# Altium footprint library Pasivos.PcbLib: 138 footprints (part 6 of 9)
Each footprint in its own frame and in the unit in brackets; x right, y up, seen from the top. Pads: shape width x height; smd on the part's side, far side on the other; paste and mask are expansions set on the pad; w line width, h text height; cw(c..) or ccw(c..) is an arc to the next point about the centre after c.
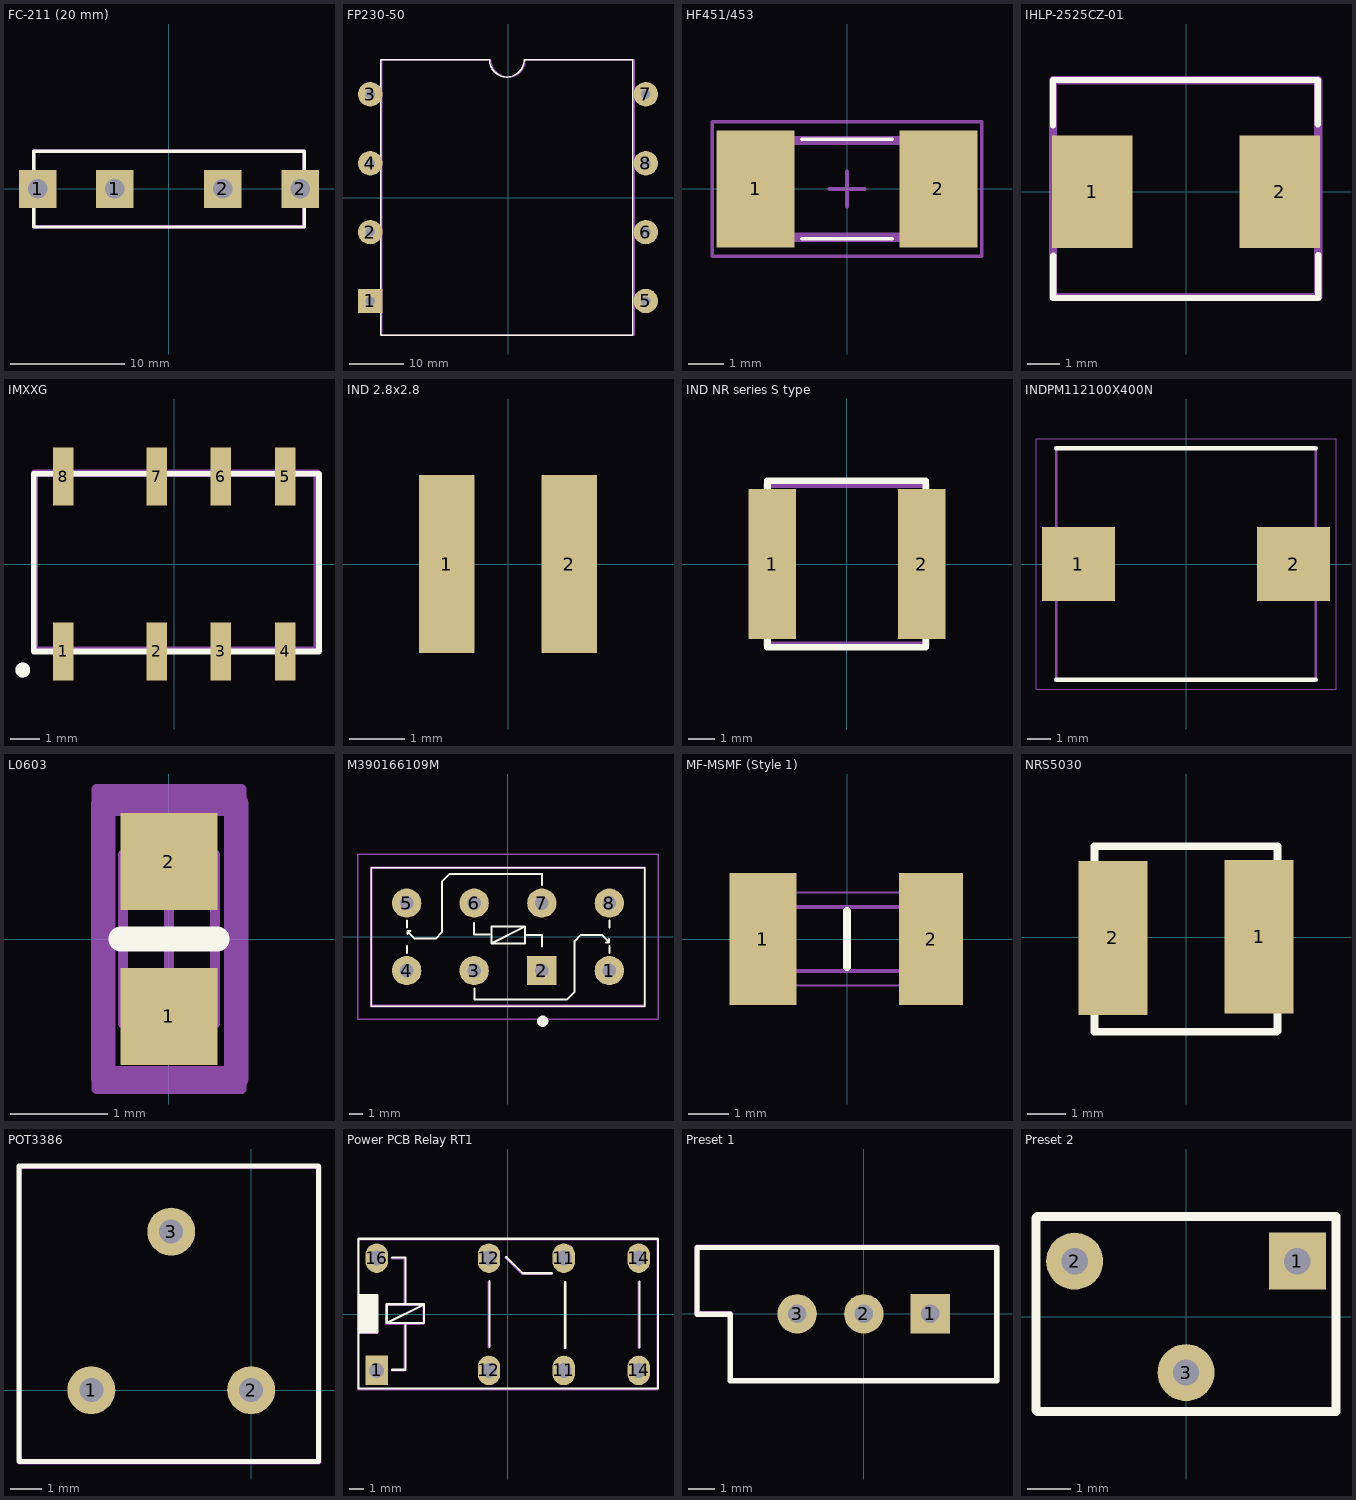
[diagram p5: the footprints below, top view; thin cyan lines are the x and y axes]

## FC-211 (20 mm) [mm] "FUSE CLIP CARTRIDGE 10A PCB"
pads (4):
  rect 3.3x3.3 hole 1.72: 1(-11.485,0) 1(-4.754,0) 2(4.705,0) 2(11.485,0)
Top Overlay:
  lines w0.3: -11.825,-3.333 11.845,-3.333 11.845,3.287 -11.825,3.287 -11.825,-3.333
Mechanical 29:
  lines w0.3: -11.825,-3.3 -11.825,3.32 11.845,3.32 11.845,-3.3 -11.825,-3.3
  text "'.Designator'" at -0.386,-0.079 h0.5
3D body "FC-201 with fuse 5x20.STEP": height 8.63, standoff -3.56, extent -11.684,-3.135 11.694,3.215

## FP230-50 [mm] "Power Transformer"
pads (8):
  rect 4.5x4.5 hole 1.7: 1(-25.4,-19.05)
  round 4.5 hole 1.7: 2(-25.4,-6.35) 3(-25.4,19.05) 4(-25.4,6.35) 5(25.4,-19.05) 6(25.4,-6.35) 7(25.4,19.05) 8(25.4,6.35)
Top Overlay:
  lines w0.254: -23.45,-25.4 -23.45,25.4 -3.384,25.4 ccw(c-0.209,25.4) 2.966,25.4 23.032,25.4 23.032,-25.4 -23.45,-25.4
Mechanical 29:
  lines w0.254: -23.241,-25.4 23.241,-25.4 23.241,25.4 3.175,25.4 cw(c0,25.4) -3.175,25.4 -23.241,25.4 -23.241,-25.4
  text "'.Designator'" at -0.314,-0.053 h0.5
3D body "Triad Magnetics-FP230-50.step": height 27.11, standoff -6.65, extent -33.04,-25.48 33,25.32

## HF451/453 [mm] "451/453 Series Fuse"
height 2.69
pads (2):
  rect 2.2x3.3 smd: 1(-2.575,0) 2(2.575,0)
Top Overlay:
  lines w0.1: -1.27,-1.397 1.27,-1.397 ; -1.27,1.397 1.27,1.397
Mechanical 13:
  lines w0.1: -3.05,-1.345 3.05,-1.345 3.05,1.345 -3.05,1.345 -3.05,-1.345
Mechanical 15:
  lines w0.1: -0.5,0 0.5,0 ; 0,-0.5 0,0.5 ; -3.8,-1.9 3.8,-1.9 3.8,1.9 -3.8,1.9 -3.8,-1.9
Mechanical 29:
  lines w0.254: -3.263,-1.359 3.337,-1.359 3.337,1.361 -3.263,1.361 -3.263,-1.359
  text "'.Designator'" at -2.754,-0.296 h0.5
3D body "HF451.STEP": height 2.69, standoff 0, extent -3.05,-1.293 3.05,1.397

## IHLP-2525CZ-01 [mm] "IHLP-2525CZ-01 Series SMD High Current Inductor"
pads (2):
  rect 2.5x3.5 smd: 1(-2.921,0) 2(2.921,0)
Top Overlay:
  lines w0.2: -4.141,2.07 -4.141,3.48 4.109,3.48 4.109,2.1 ; -4.131,-2 -4.131,-3.31 4.119,-3.31 4.119,-1.97
Mechanical 29:
  lines w0.254: -4.139,-3.279 -4.139,3.472 4.117,3.472 4.117,-3.279 -4.139,-3.279
  text "'.Designator'" at -2.761,-0.296 h0.5
3D body "IHLP.STEP": height 3.26, standoff 0.03, extent -3.754,-3.313 3.846,3.487

## IMXXG [mm] "Relay IM"
pads (8):
  rect 0.7x2 smd: 1(-3.8,-3) 2(-0.6,-3) 3(1.6,-3) 4(3.8,-3) 5(3.8,3) 6(1.6,3) 7(-0.6,3) 8(-3.8,3)
Top Overlay:
  circle w0.254: c-5.197,-3.635 r0.127
  lines w0.2: -4.816,-3 4.963,-3 4.963,3.096 -4.816,3.096 -4.816,-3
Mechanical 29:
  circle w0.254: c-5.197,-3.635 r0.127
  lines w0.254: -4.792,-2.95 4.896,-2.95 4.896,3.105 -4.792,3.105 -4.792,-2.95
  text "'.Designator'" at -4.187,-0.15 h0.5
3D body "c-1462037-2-a-3d.stp": height 5.65, standoff 0, extent -4.99,-3.785 5.01,3.731

## IND 2.8x2.8 [mm]
height 2.8
pads (2):
  rect 1x3.2 smd: 1(-1.1,0) 2(1.1,0)
3D body "User Library-WE-TPC-1.step": height 2.8, standoff 0, extent -1.41,-1.421 1.39,1.379

## IND NR series S type [mm] "SMD Power Inductors (NR series S type)"
pads (2):
  rect 1.8x5.7 smd: 1(-2.835,0) 2(2.835,0)
Top Overlay:
  lines w0.254: -3.015,-3.15 2.985,-3.15 2.985,3.15 -3.015,3.15 -3.015,-3.15
Mechanical 29:
  lines w0.254: -3.031,-3.056 2.996,-3.056 2.996,2.999 -3.031,2.999 -3.031,-3.056
  text "'.Designator'" at -2.548,-0.25 h0.5

## INDPM112100X400N [mm]
pads (2):
  rect 3.15x3.2 smd: 1(-4.65,0) 2(4.65,0)
Top Overlay:
  lines w0.2: -5.6,-5 5.6,-5 ; -5.6,5 5.6,5
Mechanical 13:
  lines w0.1: -5.6,-5 5.6,-5 5.6,5 -5.6,5 -5.6,-5
Mechanical 15:
  lines w0.05: -6.475,-5.4 6.475,-5.4 6.475,5.4 -6.475,5.4 -6.475,-5.4
3D body "FDVE1040-H-2R2M=P3.stp": height 4, standoff 0, extent -5.6,-5 5.6,5

## L0603 [mm] "1.60mm x 0.80mm"
pads (2):
  rect 1x1 smd: 1(0,-0.8) 2(0,0.8)
Top Overlay:
  lines w0.254: -0.5,0 0.5,0
Mechanical 13:
  lines w0.1: -0.475,-0.875 0.475,-0.875 0.475,0.875 -0.475,0.875 -0.475,-0.875
Mechanical 15:
  lines w0.1: -0.475,0 0.475,0 ; 0,-0.475 0,0.475 ; -0.75,-1.55 0.75,-1.55 0.75,1.55 -0.75,1.55 -0.75,-1.55
Mechanical 29:
  lines w0.254: -0.68,-1.439 -0.68,1.397 0.693,1.397 0.693,-1.439 -0.68,-1.439
  text "'.Designator'" at 0.209,-1.116 h0.5
3D body "0603L.step": height 0.78, standoff -0.01, extent -0.475,-0.8 0.475,0.8

## M390166109M [mm]
pads (8):
  round 2.2 hole 1.04: 1(7.62,-2.54) 3(-2.54,-2.54) 4(-7.62,-2.54) 5(-7.62,2.54) 6(-2.54,2.54) 7(2.54,2.54) 8(7.62,2.54)
  rect 2.2x2.2 hole 1.04: 2(2.54,-2.54)
Top Overlay:
  circle w0.5: c2.606,-6.354 r0.174
  lines w0.1: -10.287,-5.207 -10.287,5.207 10.287,5.207 10.287,-5.207 -10.287,-5.207
  lines w0.152: -7.617,-1.204 -7.617,-0.678 ; -7.615,0.698 -7.615,1.224 ; -7.573,0.199 -7.573,0.424 ; -7.346,0.436 -7.571,0.436 -7.575,0.432 -7.015,-0.128 -5.452,-0.128 -4.976,0.348 -4.976,4.152 -4.387,4.741 2.56,4.741 ; -2.552,1.051 -2.552,0.162 -1.374,0.162 ; -2.532,-4.73 -2.532,-3.891 ; -2.524,-4.723 4.423,-4.723 5.012,-4.134 5.012,-0.33 5.488,0.146 7.051,0.146 7.611,-0.414 7.607,-0.418 7.382,-0.418 ; 1.373,0.151 2.55,0.151 2.55,-0.738 ; 2.568,3.91 2.568,4.748 ; 7.608,-0.406 7.608,-0.18 ; 7.651,-1.206 7.651,-0.68 ; 7.653,0.696 7.653,1.222 ; -1.258,-0.486 -1.258,0.784 0.012,0.784 1.282,0.784 ; -1.258,-0.486 0.012,-0.486 1.282,-0.486 1.282,0.784 ; -1.258,-0.486 1.282,0.784
Mechanical 13:
  lines w0.2: -10.287,-5.207 -10.287,5.207 10.287,5.207 10.287,-5.207 -10.287,-5.207
Mechanical 15:
  lines w0.1: -11.287,-6.207 -11.287,6.207 11.287,6.207 11.287,-6.207 -11.287,-6.207
3D body "M39016_6-109M.stp": height 10.41, standoff -5, extent -10.287,-5.207 10.287,5.207

## MF-MSMF (Style 1) [mm] "PTC Resettable Fuses"
pads (2):
  rect 1.68x3.3 smd: 1(-2.1,0)
  rect 1.6x3.3 smd: 2(2.1,0)
Top Overlay:
  lines w0.2: 0,-0.7 0,0.7
Mechanical 15:
  lines w0.1: -1.6,-0.8 1.6,-0.8 1.6,0.8 -1.6,0.8 -1.6,-0.8
Mechanical 20:
  lines w0.05: -2.31,-1.16 2.31,-1.16 2.31,1.16 -2.31,1.16 -2.31,-1.16
3D body "mf-msmf050.stp": height 0.7, standoff 0, extent -2.275,-1.62 2.275,1.62

## NRS5030 [mm] "Power Inductor"
pads (2):
  rect 1.8x4 smd: 1(1.9,0.015) 2(-1.9,-0.015)
Top Overlay:
  lines w0.2: -2.38,-2.455 -2.38,2.365 2.38,2.365 2.38,-2.435 2.36,-2.455 -2.38,-2.455
3D body "SMDpowerInductor.step": height 3, standoff 0, extent -2.5,-2.445 2.4,2.455

## POT3386 [mil]
pads (3):
  round 60 hole 30: 1(-200,0) 2(0,0) 3(-100,198.43)
Top Overlay:
  lines w5.91: -290.55,-89.45 84.45,-89.45 84.45,280.55 -290.55,280.55 -290.55,-89.45
Mechanical 29:
  lines w5.91: -290,-90 -290,280 85,280 85,-90 -290,-90
  text "'.Designator'" at -209.96,84.17 h19.68
3D body "Bourns 3386P.step": height 175.2, standoff -118.11, extent -290,-87.6 85.2,287.6

## Power PCB Relay RT1 [mil] "Power PCB Relay RT1, 16A"
pads (8):
  rect 60x78.74 hole 40: 1(-350,-150)
  oval 60x78.74 hole 40: 11(150,-150) 11(150,150) 12(-50,-150) 12(-50,150) 14(350,-150) 14(350,150) 16(-350,150)
Top Overlay:
  rectangle: -398.4,-48.4 -348.4,51.6
  lines w6: -308.4,-148.4 -273.4,-148.4 -273.4,-23.4 ; -308.4,151.6 -273.4,151.6 -273.4,26.6 ; -48.79,-86.59 -48.79,89 ; -3.91,152.78 40.58,109.47 117.74,109.47 ; 153.96,-89.35 153.96,86.25 ; 351.99,-88.56 351.99,87.03 ; -398.4,-48.4 -398.4,-198.4 401.6,-198.4 401.6,201.6 -398.4,201.6 -398.4,51.6 ; -398.4,-48.4 -348.4,-48.4 -348.4,51.6 -398.4,51.6 ; -398.4,-48.4 -398.4,51.6 ; -323.4,-23.4 -223.4,26.6 ; -323.4,-23.4 -273.4,-23.4 ; -323.4,-23.4 -323.4,26.6 -273.4,26.6 ; -273.4,-23.4 -223.4,-23.4 -223.4,26.6 ; -273.4,26.6 -223.4,26.6
Mechanical 29:
  rectangle: -400,-50 -350,50
  lines w6: -310,-150 -275,-150 -275,-25 ; -310,150 -275,150 -275,25 ; -50.39,-88.19 -50.39,87.4 ; -5.51,151.18 38.98,107.87 116.14,107.87 ; 152.36,-90.94 152.36,84.65 ; 350.39,-90.16 350.39,85.43 ; -400,-50 -400,50 ; -400,-50 -350,-50 -350,50 -400,50 ; -400,-50 -400,-200 400,-200 400,200 -400,200 -400,50 ; -325,-25 -325,25 -275,25 ; -325,-25 -275,-25 ; -325,-25 -225,25 ; -275,-25 -225,-25 -225,25 ; -275,25 -225,25
  text "'.Designator'" at -172.89,-139.74 h19.68
3D body "rly_dpdt_20x9_8x12mm.step": height 474.41, standoff -137.8, extent -395,-187.91 392.4,197.91

## Preset 1 [mm] "Multivueltas 15v"
pads (3):
  rect 1.5x1.5 hole 0.7: 1(2.54,0)
  round 1.5 hole 0.7: 2(0,0) 3(-2.54,0)
Top Overlay:
  lines w0.2: -6.36,-0.01 -6.36,2.53 5.07,2.53 5.07,-2.55 -5.09,-2.55 -5.09,-0.01 -6.36,-0.01
Mechanical 29:
  lines w0.2: -6.35,0 -5.08,0 -5.08,-2.54 5.08,-2.54 5.08,2.54 -6.35,2.54 -6.35,0
  text "'.Designator'" at -4.522,-1.945 h0.5
3D body "Potenciometro Vertical.step": height 12.16, standoff -5.34, extent -4.6,-2.413 4.6,2.387

## Preset 2 [mm] "Multivueltas 15v"
pads (3):
  rect 1.3x1.3 hole 0.6: 1(2.54,1.27)
  round 1.3 hole 0.6: 2(-2.54,1.27) 3(0,-1.27)
Top Overlay:
  lines w0.2: -3.422,-2.132 -3.422,2.262 -3.394,2.29 3.42,2.29 3.42,-2.159 -3.395,-2.159 -3.422,-2.132
Mechanical 1:
  text "Tener cuidado con la distribucion de pines" at -3.925,-2.588 h0.2
3D body "3262w.stp": height 7.42, standoff -4.73, extent -3.075,-2.064 3.275,2.254